# Altium integrated library Self made library.IntLib: 370 symbols (part 2 of 3) (continued)
## R0603_2.2K
designator R?  Résistance: 2.2 kOhms
Manufacturer 1: Vishay / Dale; Manufacturer Part Number 1: CRCW06032K20FKEB; Description 1: Résistances à couches épaisses - CMS 1/10watt 2.2Kohms 1%; Plage de températures de fonctionnement: - 55 C to + 155 C; Package/Boîte: 0603 (1608 metric); Conditionnement: Reel; Données de puissance: 100 mW; Produit: Thick Film Resistors SMD; Série: CRCW; Coefficient de température: 100 PPM / K; Tolérance: 1 %; Tension de voltage: 75 V; Code de caisse - po: 0603; Code de caisse - mm: 1608; Hauteur du boîtier: 0.45 mm; Longueur du boîtier: 1.55 mm; Largeur du boîtier: 0.85 mm; Fabricant: Vishay; Catégorie du produit: 0603 Thick Film Chip Resistors; Quantité standard du lot: 10000; Supplier 1: Mouser; Supplier Part Number 1: 71-CRCW06032K20FKEB; RoHS: RoHS Compliant By Exemption; Category: Résistances à couches épaisses - CMS; Stock 1: 28675; Pricing 1: 1=0.096, 10=0.013, 100=0.009, 1000=0.007, 10000=0.005, 30000=0.004, 50000=0.003 (CHF); Marque: Vishay / Dale; RoHS - Mouser: E; Minimum Order Quantity: 1; Reeling: True; ComponentLink1URL: http://www.mouser.com/ds/2/427/dcrcwe3-109170.pdf; ComponentLink1Description: http://www.mouser.com/ds/2/427/dcrcwe3-109170.pdf
footprint R0603
pins: 1, 2

## R0603_10K
designator ?R  Résistance: 10 kOhms
Manufacturer 1: Vishay / Dale; Manufacturer Part Number 1: CRCW060310K0FKEA; Description 1: Résistances à couches épaisses - CMS 1/10watt 10Kohms 1%; Plage de températures de fonctionnement: - 55 C to + 155 C; Package/Boîte: 0603 (1608 metric); Conditionnement: Reel; Données de puissance: 100 mW; Produit: Thick Film Resistors SMD; Série: CRCW; Coefficient de température: 100 PPM / K; Tolérance: 1 %; Tension de voltage: 75 V; Code de caisse - po: 0603; Code de caisse - mm: 1608; Hauteur du boîtier: 0.45 mm; Longueur du boîtier: 1.55 mm; Largeur du boîtier: 0.85 mm; Fabricant: Vishay; Catégorie du produit: 0603 Thick Film Chip Resistors; Quantité standard du lot: 5000; Supplier 1: Mouser; Supplier Part Number 1: 71-CRCW0603-10K-E3; RoHS: RoHS Compliant By Exemption; Category: Résistances à couches épaisses - CMS; Stock 1: 1170562; Pricing 1: 1=0.096, 10=0.042, 100=0.025, 500=0.020, 1000=0.017, 5000=0.005, 50000=0.004 (CHF); Marque: Vishay / Dale; RoHS - Mouser: E; Minimum Order Quantity: 1; Reeling: True; ComponentLink1URL: http://www.mouser.com/ds/2/427/dcrcwe3-109170.pdf; ComponentLink1Description: http://www.mouser.com/ds/2/427/dcrcwe3-109170.pdf
footprint R0603
pins: 1, 2

## R0603_45.3K
designator R?  Résistance: 45.3 kOhms
Manufacturer 1: Vishay / Dale; Manufacturer Part Number 1: CRCW060345K3FKEA; Description 1: Résistances à couches épaisses - CMS 1/10watt 45.3Kohms 1%; Plage de températures de fonctionnement: - 55 C to + 155 C; Package/Boîte: 0603 (1608 metric); Conditionnement: Reel; Données de puissance: 100 mW; Produit: Thick Film Resistors SMD; Série: CRCW; Coefficient de température: 100 PPM / K; Tolérance: 1 %; Tension de voltage: 75 V; Code de caisse - po: 0603; Code de caisse - mm: 1608; Hauteur du boîtier: 0.45 mm; Longueur du boîtier: 1.55 mm; Largeur du boîtier: 0.85 mm; Fabricant: Vishay; Catégorie du produit: 0603 Thick Film Chip Resistors; Quantité standard du lot: 5000; Supplier 1: Mouser; Supplier Part Number 1: 71-CRCW0603-45.3K-E3; RoHS: RoHS Compliant By Exemption; Category: Résistances à couches épaisses - CMS; Stock 1: 29593; Pricing 1: 1=0.096, 10=0.042, 100=0.025, 500=0.020, 1000=0.017, 5000=0.005, 50000=0.004 (CHF); Marque: Vishay / Dale; RoHS - Mouser: E; Minimum Order Quantity: 1; Reeling: True; ComponentLink1URL: http://www.mouser.com/ds/2/427/dcrcwe3-109170.pdf; ComponentLink1Description: http://www.mouser.com/ds/2/427/dcrcwe3-109170.pdf
footprint R0603
pins: 1, 2

## R0603_69.8K
designator R?  Résistance: 69.8 kOhms
Manufacturer 1: Vishay / Dale; Manufacturer Part Number 1: CRCW060369K8FKEA; Description 1: Résistances à couches épaisses - CMS 1/10watt 69.8Kohms 1%; Plage de températures de fonctionnement: - 55 C to + 155 C; Package/Boîte: 0603 (1608 metric); Conditionnement: Reel; Données de puissance: 100 mW; Produit: Thick Film Resistors SMD; Série: CRCW; Coefficient de température: 100 PPM / K; Tolérance: 1 %; Tension de voltage: 75 V; Code de caisse - po: 0603; Code de caisse - mm: 1608; Hauteur du boîtier: 0.45 mm; Longueur du boîtier: 1.55 mm; Largeur du boîtier: 0.85 mm; Fabricant: Vishay; Catégorie du produit: 0603 Thick Film Chip Resistors; Quantité standard du lot: 5000; Supplier 1: Mouser; Supplier Part Number 1: 71-CRCW0603-69.8K-E3; RoHS: RoHS Compliant By Exemption; Category: Résistances à couches épaisses - CMS; Stock 1: 48984; Pricing 1: 1=0.096, 10=0.042, 100=0.025, 500=0.020, 1000=0.017, 5000=0.005, 50000=0.004 (CHF); Marque: Vishay / Dale; RoHS - Mouser: E; Minimum Order Quantity: 1; Reeling: True; ComponentLink1URL: http://www.mouser.com/ds/2/427/dcrcwe3-109170.pdf; ComponentLink1Description: http://www.mouser.com/ds/2/427/dcrcwe3-109170.pdf
footprint R0603
pins: 1, 2

## R0603_100K
designator R?  Résistance: 100 kOhms
Manufacturer 1: Vishay / Dale; Manufacturer Part Number 1: CRCW0603100KFKEA; Description 1: Résistances à couches épaisses - CMS 1/10watt 100Kohms 1%; Plage de températures de fonctionnement: - 55 C to + 155 C; Package/Boîte: 0603 (1608 metric); Conditionnement: Reel; Données de puissance: 100 mW; Produit: Thick Film Resistors SMD; Série: CRCW; Coefficient de température: 100 PPM / K; Tolérance: 1 %; Tension de voltage: 75 V; Code de caisse - po: 0603; Code de caisse - mm: 1608; Hauteur du boîtier: 0.45 mm; Longueur du boîtier: 1.55 mm; Largeur du boîtier: 0.85 mm; Fabricant: Vishay; Catégorie du produit: 0603 Thick Film Chip Resistors; Quantité standard du lot: 5000; Supplier 1: Mouser; Supplier Part Number 1: 71-CRCW0603-100K-E3; RoHS: RoHS Compliant By Exemption; Category: Résistances à couches épaisses - CMS; Stock 1: 529180; Pricing 1: 1=0.096, 10=0.042, 100=0.025, 500=0.020, 1000=0.017, 5000=0.005, 50000=0.004 (CHF); Marque: Vishay / Dale; RoHS - Mouser: E; Minimum Order Quantity: 1; Reeling: True; ComponentLink1URL: http://www.mouser.com/ds/2/427/dcrcwe3-109170.pdf; ComponentLink1Description: http://www.mouser.com/ds/2/427/dcrcwe3-109170.pdf
footprint R0603
pins: 1, 2

## R0603_182K
designator R?  Résistance: 182 kOhms
Manufacturer 1: Vishay / Dale; Manufacturer Part Number 1: CRCW0603182KFKEA; Description 1: Résistances à couches épaisses - CMS 1/10watt 182Kohms 1%; Plage de températures de fonctionnement: - 55 C to + 155 C; Package/Boîte: 0603 (1608 metric); Conditionnement: Reel; Données de puissance: 100 mW; Produit: Thick Film Resistors SMD; Série: CRCW; Coefficient de température: 100 PPM / K; Tolérance: 1 %; Tension de voltage: 75 V; Code de caisse - po: 0603; Code de caisse - mm: 1608; Hauteur du boîtier: 0.45 mm; Longueur du boîtier: 1.55 mm; Largeur du boîtier: 0.85 mm; Fabricant: Vishay; Catégorie du produit: 0603 Thick Film Chip Resistors; Quantité standard du lot: 5000; Supplier 1: Mouser; Supplier Part Number 1: 71-CRCW0603-182K-E3; RoHS: RoHS Compliant By Exemption; Category: Résistances à couches épaisses - CMS; Stock 1: 40824; Pricing 1: 1=0.096, 10=0.042, 100=0.025, 500=0.020, 1000=0.017, 5000=0.005, 50000=0.004 (CHF); Marque: Vishay / Dale; RoHS - Mouser: E; Minimum Order Quantity: 1; Reeling: True; ComponentLink1URL: http://www.mouser.com/ds/2/427/dcrcwe3-109170.pdf; ComponentLink1Description: http://www.mouser.com/ds/2/427/dcrcwe3-109170.pdf
footprint R0603
pins: 1, 2

## R0603_220K
designator R?  Résistance: 220 kOhms  (hidden comment: R0603_220K)
MANUFACTURER: Vishay; MANUFACTURER_PART_NUMBER: CRCW0603220RFKEA; Manufacturer 1: Vishay / Dale; Manufacturer Part Number 1: CRCW0603220KJNEB; UNIT_PRICE: 0.076; Description 1: Résistances à couches épaisses - CMS 1/10watt 220Kohms 5%; Plage de températures de fonctionnement: - 55 C to + 155 C; Package/Boîte: 0603 (1608 metric); Conditionnement: Reel; Données de puissance: 100 mW; Produit: Thick Film Resistors SMD; Série: CRCW; Coefficient de température: 200 PPM / K; Tolérance: 5 %; Tension de voltage: 75 V; Code de caisse - po: 0603; Code de caisse - mm: 1608; Hauteur du boîtier: 0.45 mm; Longueur du boîtier: 1.55 mm; Largeur du boîtier: 0.85 mm; Catégorie du produit: 0603 Thick Film Chip Resistors; Quantité standard du lot: 10000; SUPPLIER: Mouser; SUPPLIER_PART_NUMBER: 71-CRCW0603-220-E3; Supplier 1: Mouser; Supplier Part Number 1: 71-CRCW0603220KJNEB; RoHS: RoHS Compliant By Exemption; Category: Résistances à couches épaisses - CMS; Stock 1: 39750; Pricing 1: 1=0.096, 10=0.012, 100=0.008, 10000=0.004, 30000=0.002 (CHF); Marque: Vishay / Dale; Fabricant: Vishay; RoHS - Mouser: E; Minimum Order Quantity: 1; Reeling: True; ComponentLink1URL: http://www.mouser.com/ds/2/427/dcrcwe3-109170.pdf; ComponentLink1Description: http://www.mouser.com/ds/2/427/dcrcwe3-109170.pdf
footprint R0603
pins: 1, 2

## R0603_220R
designator R?  Résistance: 220 Ohms  (hidden comment: R0603_220R)
Manufacturer 1: Vishay / Dale; Manufacturer Part Number 1: CRCW0603220RFKEA; Description 1: Résistances à couches épaisses - CMS 1/10watt 220ohms 1%; Plage de températures de fonctionnement: - 55 C to + 155 C; Package/Boîte: 0603 (1608 metric); Conditionnement: Reel; Données de puissance: 100 mW; Produit: Thick Film Resistors SMD; Série: CRCW; Coefficient de température: 100 PPM / K; Tolérance: 1 %; Tension de voltage: 75 V; Code de caisse - po: 0603; Code de caisse - mm: 1608; Hauteur du boîtier: 0.45 mm; Longueur du boîtier: 1.55 mm; Largeur du boîtier: 0.85 mm; Fabricant: Vishay; Catégorie du produit: 0603 Thick Film Chip Resistors; Quantité standard du lot: 5000; Supplier 1: Mouser; Supplier Part Number 1: 71-CRCW0603-220-E3; RoHS: RoHS Compliant By Exemption; Category: Résistances à couches épaisses - CMS; Stock 1: 64079; Pricing 1: 1=0.096, 10=0.042, 100=0.025, 500=0.020, 1000=0.017, 5000=0.005, 50000=0.004 (CHF); Marque: Vishay / Dale; RoHS - Mouser: E; Minimum Order Quantity: 1; Reeling: True; ComponentLink1URL: http://www.mouser.com/ds/2/427/dcrcwe3-109170.pdf; ComponentLink1Description: http://www.mouser.com/ds/2/427/dcrcwe3-109170.pdf
footprint R0603
pins: 1, 2

## R2010_0.01R
designator R?  Resistance: 0.01 Ohms
Manufacturer: Vishay / Dale; Manufacturer Part Number: WSL2010R0100FEA18; Power Rating: 1 W; Temperature Coefficient: 75 PPM / C; Tolerance: 1 %; Case Height: 0.635 mm; Case Length: 5 mm; Case Width: 2.5 mm; Supplier 1: Mouser; RoHS: RoHS Compliant; Category: Current Sense Resistors - SMD; Stock 1: 15681; Pricing 1: 1=1.05, 25=0.884, 100=0.765, 250=0.646, 500=0.544, 1000=0.453, 4000=0.404 (CHF); Operating Temperature Range: - 65 C to + 170 C; Package/Case: 2010 (5025 metric); Packaging: Reel; Product: Metal Element Current Sensing Resistors; Series: WSL..18; Termination Style: SMD/SMT; Type: Power Metal Strip Resistor; Brand: Vishay / Dale; Case Code - in: 2010; Case Code - mm: 5025; Product Category: SMD Power Metal Strip/Current Sensing Resistors; Standard Pack Qty: 4000; Tradename: Power Metal Strip; RoHS - Mouser: Y; Minimum Order Quantity: 1; Reeling: True; ComponentLink1URL: http://www.mouser.com/ds/2/427/wslhigh-101698.pdf; ComponentLink1Description: http://www.mouser.com/ds/2/427/wslhigh-101698.pdf; Supplier Part Number 1: 71-WSL2010R0100FEA18
footprint 2010_2
pins: 1, 2

## R_0402
designator ?, comment Résistance avec différents footprints
footprint R0402
pins: 1, 2

## R_603
designator ?, comment Résistance avec différents footprints
footprint R0603
pins: 1, 2

## R_805
designator ?, comment Résistance avec différents footprints
footprint 0805
pins: 1, 2

## R_1206
designator ?, comment Résistance avec différents footprints
footprint 1206
pins: 1, 2

## R_1210
designator ?, comment Résistance avec différents footprints
footprint 1210
pins: P$1 1, P$2 2

## REFROIDISSEUR
designator ?
footprint FK245MI247V
pins: P$1, P$2

## REGUL_3.3V_TSR_1_2433
designator IC?, comment VOLTAGE REGULATOR
footprint DC-DC_TSR-1
pins: 1 IN, 2 REG, 3 OUT

## REGUL_5V_TSR_1_2450
designator IC?, comment VOLTAGE REGULATOR
footprint DC-DC_TSR-1
pins: 1 IN, 2 REG, 3 OUT

## REPETEUR_COUVERCLE
designator ?
footprint 0603

## RES_805
designator ?
footprint 0805
pins: 1, 2

## RES_1206_0R
designator R?  Resistance: 0 Ohms  (hidden comment: RES_1206_0R)
Manufacturer: Vishay / Dale; Manufacturer Part Number: CRCW12060000Z0EA; Case Height: 0.55 mm; Case Length: 3.2 mm; Case Width: 1.6 mm; Digger CMP: CMP3842; Supplier 1: Mouser; RoHS: RoHS Compliant By Exemption; Category: Thick Film Resistors - SMD; Stock 1: 565688; Pricing 1: 1=0.096, 10=0.021, 100=0.013, 500=0.011, 1000=0.008, 5000=0.008, 10000=0.007, 25000=0.006, 50000=0.005 (CHF); Operating Temperature Range: - 55 C to + 155 C; Package/Case: 1206 (3216 metric); Packaging: Reel; Power Rating: -; Product: Thick Film Resistors Zero-Ohm; Series: CRCW; Temperature Coefficient: -; Tolerance: -; Voltage Rating: -; Brand: Vishay / Dale; Case Code - in: 1206; Case Code - mm: 3216; Product Category: 1206 Thick Film Chip Resistors; Standard Pack Qty: 5000; RoHS - Mouser: E; Minimum Order Quantity: 1; Reeling: True; ComponentLink1URL: http://www.mouser.com/ds/2/427/dcrcwe3-109170.pdf; ComponentLink1Description: http://www.mouser.com/ds/2/427/dcrcwe3-109170.pdf; Supplier Part Number 1: 71-CRCW1206-0-E3
footprint 1206
pins: 1, 2

## RES_1206_1K
designator R?  Resistance: 1 kOhms  (hidden comment: RES_1206_1K)
Manufacturer: Vishay / Dale; Manufacturer Part Number: CRCW12061K00FKEAHP; Power Rating: 500 mW (1/2 W); Temperature Coefficient: 100 PPM / C; Tolerance: 1 %; Voltage Rating: 200 V; Case Height: 0.5 mm; Case Length: 3.2 mm; Case Width: 1.6 mm; Digger CMP: CMP3565; Supplier 1: Mouser; RoHS: RoHS Compliant By Exemption; Category: Thick Film Resistors - SMD; Stock 1: 22378; Pricing 1: 1=0.427, 10=0.263, 100=0.151, 1000=0.103, 5000=0.096, 10000=0.085, 25000=0.076, 50000=0.064, 100000=0.054 (CHF); Operating Temperature Range: - 55 C to + 155 C; Package/Case: 1206 (3216 metric); Packaging: Reel; Product: Thick Film Resistors SMD; Series: CRCW-HP e3; Type: Pulse Proof, High Power Thick Film Chip Resistors; Brand: Vishay / Dale; Case Code - in: 1206; Case Code - mm: 3216; Case Diameter: -; Product Category: 1206 Thick Film Chip Resistors; Standard Pack Qty: 5000; RoHS - Mouser: E; Minimum Order Quantity: 1; Reeling: True; ComponentLink1URL: http://www.mouser.com/ds/2/427/crcwhpe3-46056.pdf; ComponentLink1Description: http://www.mouser.com/ds/2/427/crcwhpe3-46056.pdf; Supplier Part Number 1: 71-CRCW12061K00FKEAH
footprint 1206
pins: 1, 2

## RES_1206_2K2
designator R?  Resistance: 2.2 kOhms  (hidden comment: RES_1206_2K2)
Manufacturer: Vishay / Dale; Manufacturer Part Number: CRCW12062K20FKEAHP; Power Rating: 500 mW (1/2 W); Temperature Coefficient: 100 PPM / C; Tolerance: 1 %; Voltage Rating: 200 V; Case Height: 0.5 mm; Case Length: 3.2 mm; Case Width: 1.6 mm; Product Status: New at Mouser; Digger CMP: CMP4435; Supplier 1: Mouser; RoHS: RoHS Compliant By Exemption; Category: Thick Film Resistors - SMD; Stock 1: 908; Pricing 1: 1=0.446, 10=0.245, 100=0.141, 1000=0.096, 5000=0.087, 10000=0.085, 25000=0.075, 50000=0.063, 100000=0.053 (CHF); Operating Temperature Range: - 55 C to + 155 C; Package/Case: 1206 (3216 metric); Packaging: Reel; Product: Thick Film Resistors SMD; Series: CRCW-HP e3; Type: Pulse Proof, High Power Thick Film Chip Resistors; Brand: Vishay / Dale; Case Code - in: 1206; Case Code - mm: 3216; Case Diameter: -; Product Category: 1206 Thick Film Chip Resistors; Standard Pack Qty: 5000; RoHS - Mouser: E; Minimum Order Quantity: 1; Reeling: True; ComponentLink1URL: http://www.mouser.com/ds/2/427/crcwhpe3-46056.pdf; ComponentLink1Description: http://www.mouser.com/ds/2/427/crcwhpe3-46056.pdf; Supplier Part Number 1: 71-CRCW12062K20FKEAH
footprint 1206
pins: 1, 2

## RES_1206_4K7
designator R?  Resistance: 4.7 kOhms  (hidden comment: RES_1206_4K7)
Manufacturer: Vishay / Dale; Manufacturer Part Number: CRCW12064K70FKEAHP; Power Rating: 500 mW (1/2 W); Temperature Coefficient: 100 PPM / C; Tolerance: 1 %; Voltage Rating: 200 V; Case Height: 0.5 mm; Case Length: 3.2 mm; Case Width: 1.6 mm; Digger CMP: CMP2487; Supplier 1: Mouser; RoHS: RoHS Compliant By Exemption; Category: Thick Film Resistors - SMD; Stock 1: 21999; Pricing 1: 1=0.427, 10=0.263, 100=0.151, 1000=0.103, 5000=0.096, 10000=0.085, 25000=0.076, 50000=0.064, 100000=0.054 (CHF); Operating Temperature Range: - 55 C to + 155 C; Package/Case: 1206 (3216 metric); Packaging: Reel; Product: Thick Film Resistors SMD; Series: CRCW-HP e3; Type: Pulse Proof, High Power Thick Film Chip Resistors; Brand: Vishay / Dale; Case Code - in: 1206; Case Code - mm: 3216; Case Diameter: -; Product Category: 1206 Thick Film Chip Resistors; Standard Pack Qty: 5000; RoHS - Mouser: E; Minimum Order Quantity: 1; Reeling: True; ComponentLink1URL: http://www.mouser.com/ds/2/427/crcwhpe3-46056.pdf; ComponentLink1Description: http://www.mouser.com/ds/2/427/crcwhpe3-46056.pdf; Supplier Part Number 1: 71-CRCW12064K70FKEAH
footprint 1206
pins: 1, 2

## RES_1206_8K2
designator R?  Resistance: 8.2 kOhms  (hidden comment: RES_1206_8K2)
Manufacturer: Vishay / Dale; Manufacturer Part Number: CRCW12068K20FKEA; Power Rating: 250 mW (1/4 W); Temperature Coefficient: 100 PPM / K; Tolerance: 1 %; Voltage Rating: 200 V; Case Height: 0.55 mm; Case Length: 3.2 mm; Case Width: 1.6 mm; Digger CMP: CMP4436; Supplier 1: Mouser; RoHS: RoHS Compliant By Exemption; Category: Thick Film Resistors - SMD; Stock 1: 18649; Pricing 1: 1=0.096, 10=0.053, 100=0.030, 1000=0.021, 5000=0.011, 10000=0.009, 25000=0.008, 50000=0.006, 100000=0.005 (CHF); Operating Temperature Range: - 55 C to + 155 C; Package/Case: 1206 (3216 metric); Packaging: Reel; Product: Thick Film Resistors SMD; Series: CRCW; Brand: Vishay / Dale; Case Code - in: 1206; Case Code - mm: 3216; Product Category: 1206 Thick Film Chip Resistors; Standard Pack Qty: 5000; RoHS - Mouser: E; Minimum Order Quantity: 1; Reeling: True; ComponentLink1URL: http://www.mouser.com/ds/2/427/dcrcwe3-109170.pdf; ComponentLink1Description: http://www.mouser.com/ds/2/427/dcrcwe3-109170.pdf; Supplier Part Number 1: 71-CRCW1206-8.2K-E3
footprint 1206
pins: 1, 2

## RES_1206_10K
designator R?  Resistance: 10 kOhms  (hidden comment: RES_1206_10K)
Manufacturer: Vishay / Dale; Manufacturer Part Number: CRCW120610K0FKEB; Power Rating: 250 mW (1/4 W); Temperature Coefficient: 100 PPM / K; Tolerance: 1 %; Voltage Rating: 200 V; Case Height: 0.55 mm; Case Length: 3.2 mm; Case Width: 1.6 mm; Digger DTR: CMP3567; Supplier 1: Mouser; RoHS: RoHS Compliant By Exemption; Category: Thick Film Resistors - SMD; Stock 1: 36112; Pricing 1: 1=0.096, 10=0.035, 100=0.026, 1000=0.009, 10000=0.006, 50000=0.005 (CHF); Operating Temperature Range: - 55 C to + 155 C; Package/Case: 1206 (3216 metric); Packaging: Reel; Product: Thick Film Resistors SMD; Series: CRCW; Brand: Vishay / Dale; Case Code - in: 1206; Case Code - mm: 3216; Product Category: 1206 Thick Film Chip Resistors; Standard Pack Qty: 10000; RoHS - Mouser: E; Minimum Order Quantity: 1; Reeling: True; ComponentLink1URL: http://www.mouser.com/ds/2/427/dcrcwe3-109170.pdf; ComponentLink1Description: http://www.mouser.com/ds/2/427/dcrcwe3-109170.pdf; Supplier Part Number 1: 71-CRCW120610K0FKEB
footprint 1206
pins: 1, 2

## RES_1206_10R
designator R?  Resistance: 10 Ohms  (hidden comment: RES_1206_10R)
Manufacturer: Vishay / Dale; Manufacturer Part Number: CRCW120610R0FKEAHP; Power Rating: 500 mW (1/2 W); Temperature Coefficient: 100 PPM / C; Tolerance: 1 %; Voltage Rating: 200 V; Case Height: 0.5 mm; Case Length: 3.2 mm; Case Width: 1.6 mm; Digger CMP: CMP3843; Supplier 1: Mouser; RoHS: RoHS Compliant By Exemption; Category: Thick Film Resistors - SMD; Stock 1: 17364; Pricing 1: 1=0.427, 10=0.263, 100=0.151, 1000=0.103, 5000=0.096, 10000=0.085, 25000=0.076, 50000=0.064, 100000=0.054 (CHF); Operating Temperature Range: - 55 C to + 155 C; Package/Case: 1206 (3216 metric); Packaging: Reel; Product: Thick Film Resistors SMD; Series: CRCW-HP e3; Type: Pulse Proof, High Power Thick Film Chip Resistors; Brand: Vishay / Dale; Case Code - in: 1206; Case Code - mm: 3216; Case Diameter: -; Product Category: 1206 Thick Film Chip Resistors; Standard Pack Qty: 5000; RoHS - Mouser: E; Minimum Order Quantity: 1; Reeling: True; ComponentLink1URL: http://www.mouser.com/ds/2/427/crcwhpe3-46056.pdf; ComponentLink1Description: http://www.mouser.com/ds/2/427/crcwhpe3-46056.pdf; Supplier Part Number 1: 71-CRCW120610R0FKEAH
footprint 1206
pins: 1, 2

## RES_1206_11K
designator R?  Resistance: 11 kOhms  (hidden comment: RES_1206_11K)
Manufacturer: Vishay / Dale; Manufacturer Part Number: CRCW120611K0FKEA; Power Rating: 250 mW (1/4 W); Temperature Coefficient: 100 PPM / K; Tolerance: 1 %; Voltage Rating: 200 V; Case Height: 0.55 mm; Case Length: 3.2 mm; Case Width: 1.6 mm; Digger DTR: CMP4437; Supplier 1: Mouser; RoHS: RoHS Compliant By Exemption; Category: Thick Film Resistors - SMD; Stock 1: 12152; Pricing 1: 1=0.096, 10=0.053, 100=0.030, 1000=0.021, 5000=0.011, 10000=0.009, 25000=0.008, 50000=0.006, 100000=0.005 (CHF); Operating Temperature Range: - 55 C to + 155 C; Package/Case: 1206 (3216 metric); Packaging: Reel; Product: Thick Film Resistors SMD; Series: CRCW; Brand: Vishay / Dale; Case Code - in: 1206; Case Code - mm: 3216; Product Category: 1206 Thick Film Chip Resistors; Standard Pack Qty: 5000; RoHS - Mouser: E; Minimum Order Quantity: 1; Reeling: True; ComponentLink1URL: http://www.mouser.com/ds/2/427/dcrcwe3-109170.pdf; ComponentLink1Description: http://www.mouser.com/ds/2/427/dcrcwe3-109170.pdf; Supplier Part Number 1: 71-CRCW1206-11K-E3
footprint 1206
pins: 1, 2

## RES_1206_51R
designator R?
footprint 1206
pins: 1, 2

## RES_1206_56R
designator R?
footprint 1206
pins: 1, 2

## RES_1206_68K
designator R?
footprint 1206
pins: 1, 2

## RES_1206_100K
designator R?  Resistance: 100 kOhms  (hidden comment: RES_1206_100K)
Manufacturer: Vishay / Dale; Manufacturer Part Number: CRCW1206100KFKEB; Power Rating: 250 mW (1/4 W); Temperature Coefficient: 100 PPM / K; Tolerance: 1 %; Voltage Rating: 200 V; Case Height: 0.55 mm; Case Length: 3.2 mm; Case Width: 1.6 mm; Digger CMP: CMP3844; Supplier 1: Mouser; RoHS: RoHS Compliant By Exemption; Category: Thick Film Resistors - SMD; Stock 1: 26788; Pricing 1: 1=0.096, 10=0.035, 100=0.026, 1000=0.009, 10000=0.006, 50000=0.005 (CHF); Operating Temperature Range: - 55 C to + 155 C; Package/Case: 1206 (3216 metric); Packaging: Reel; Product: Thick Film Resistors SMD; Series: CRCW; Brand: Vishay / Dale; Case Code - in: 1206; Case Code - mm: 3216; Product Category: 1206 Thick Film Chip Resistors; Standard Pack Qty: 10000; RoHS - Mouser: E; Minimum Order Quantity: 1; Reeling: True; ComponentLink1URL: http://www.mouser.com/ds/2/427/dcrcwe3-109170.pdf; ComponentLink1Description: http://www.mouser.com/ds/2/427/dcrcwe3-109170.pdf; Supplier Part Number 1: 71-CRCW1206100KFKEB
footprint 1206
pins: 1, 2

## RES_1206_100R
designator R?
footprint 1206
pins: 1, 2

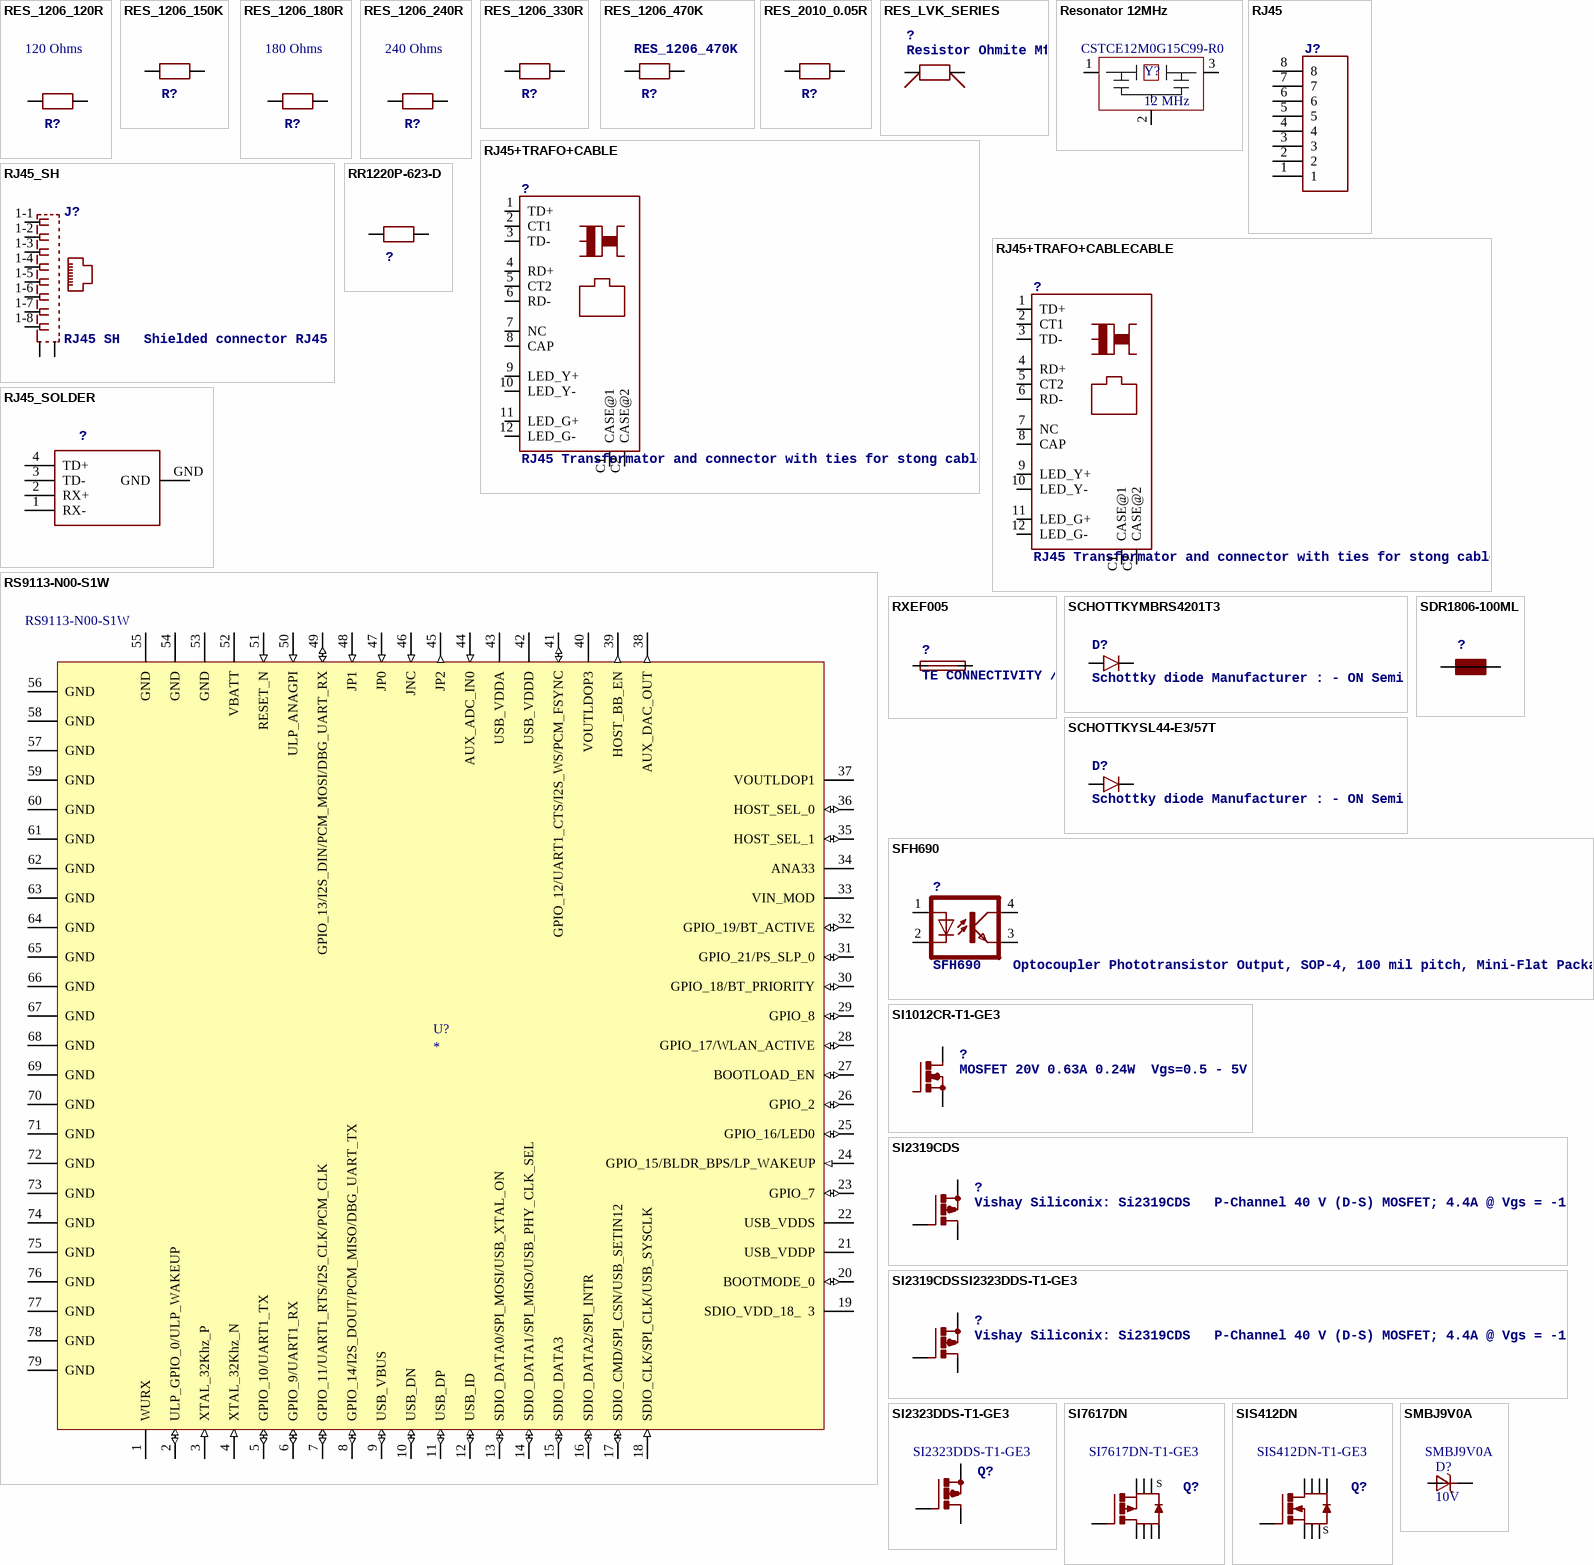
[diagram p16: symbols RES_1206_120R to SMBJ9V0A]

## RES_1206_120R
designator R?  Resistance: 120 Ohms  (hidden comment: RES_1206_120R)
Manufacturer: Vishay / Dale; Manufacturer Part Number: CRCW1206120RFKEAHP; Power Rating: 500 mW (1/2 W); Temperature Coefficient: 100 PPM / C; Tolerance: 1 %; Voltage Rating: 200 V; Case Height: 0.5 mm; Case Length: 3.2 mm; Case Width: 1.6 mm; Digger DTR: CMP3566; Supplier 1: Mouser; RoHS: RoHS Compliant By Exemption; Category: Thick Film Resistors - SMD; Stock 1: 10225; Pricing 1: 1=0.427, 10=0.233, 100=0.134, 1000=0.124, 5000=0.114, 10000=0.085, 25000=0.075, 50000=0.063, 100000=0.053 (CHF); Operating Temperature Range: - 55 C to + 155 C; Package/Case: 1206 (3216 metric); Packaging: Reel; Product: Thick Film Resistors SMD; Series: CRCW-HP e3; Type: Pulse Proof, High Power Thick Film Chip Resistors; Brand: Vishay / Dale; Case Code - in: 1206; Case Code - mm: 3216; Case Diameter: -; Product Category: 1206 Thick Film Chip Resistors; Standard Pack Qty: 5000; RoHS - Mouser: E; Minimum Order Quantity: 1; Reeling: True; ComponentLink1URL: http://www.mouser.com/ds/2/427/crcwhpe3-46056.pdf; ComponentLink1Description: http://www.mouser.com/ds/2/427/crcwhpe3-46056.pdf; Supplier Part Number 1: 71-CRCW1206120RFKEAH
footprint 1206
pins: 1, 2

## RES_1206_150K
designator R?
footprint 1206
pins: 1, 2

## RES_1206_180R
designator R?  Resistance: 180 Ohms  (hidden comment: RES_1206_180R)
Manufacturer: Vishay / Dale; Manufacturer Part Number: CRCW1206180RFKEAHP; Power Rating: 500 mW (1/2 W); Temperature Coefficient: 100 PPM / C; Tolerance: 1 %; Voltage Rating: 200 V; Case Height: 0.5 mm; Case Length: 3.2 mm; Case Width: 1.6 mm; Product Status: New at Mouser; Digger CMP: CMP4438; Supplier 1: Mouser; RoHS: RoHS Compliant; Category: Thick Film Resistors - SMD; Stock 1: 0; Pricing 1: 1=0.446, 10=0.245, 100=0.141, 1000=0.096, 5000=0.087, 10000=0.085, 25000=0.075, 50000=0.063, 100000=0.053 (CHF); Operating Temperature Range: - 55 C to + 155 C; Package/Case: 1206 (3216 metric); Packaging: Reel; Product: Thick Film Resistors SMD; Series: CRCW-HP e3; Type: Pulse Proof, High Power Thick Film Chip Resistors; Brand: Vishay / Dale; Case Code - in: 1206; Case Code - mm: 3216; Case Diameter: -; Product Category: 1206 Thick Film Chip Resistors; RoHS - Mouser: E; Minimum Order Quantity: 1; Reeling: True; ComponentLink1URL: http://www.mouser.com/ds/2/427/crcwhpe3-46056.pdf; ComponentLink1Description: http://www.mouser.com/ds/2/427/crcwhpe3-46056.pdf; Supplier Part Number 1: 71-CRCW1206180RFKEAH
footprint 1206
pins: 1, 2

## RES_1206_240R
designator R?  Resistance: 240 Ohms  (hidden comment: RES_1206_240R)
Manufacturer: Vishay / Dale; Manufacturer Part Number: CRCW1206240RJNEAHP; Power Rating: 500 mW (1/2 W); Temperature Coefficient: 200 PPM / C; Tolerance: 5 %; Voltage Rating: 200 V; Case Height: 0.5 mm; Case Length: 3.2 mm; Case Width: 1.6 mm; Digger CMP: CMP4223; Supplier 1: Mouser; RoHS: RoHS Compliant By Exemption; Category: Thick Film Resistors - SMD; Stock 1: 5000; Pricing 1: 1=0.446, 10=0.233, 100=0.134, 1000=0.091, 5000=0.083, 10000=0.075, 25000=0.066, 50000=0.055, 100000=0.046 (CHF); Operating Temperature Range: - 55 C to + 155 C; Package/Case: 1206 (3216 metric); Packaging: Reel; Product: Thick Film Resistors SMD; Series: CRCW-HP e3; Type: Pulse Proof, High Power Thick Film Chip Resistors; Brand: Vishay / Dale; Case Code - in: 1206; Case Code - mm: 3216; Case Diameter: -; Product Category: 1206 Thick Film Chip Resistors; Standard Pack Qty: 5000; RoHS - Mouser: E; Minimum Order Quantity: 1; Reeling: True; ComponentLink1URL: http://www.mouser.com/ds/2/427/crcwhpe3-46056.pdf; ComponentLink1Description: http://www.mouser.com/ds/2/427/crcwhpe3-46056.pdf; Supplier Part Number 1: 71-CRCW1206240RJNEAH
footprint 1206
pins: 1, 2

## RES_1206_330R
designator R?
footprint 1206
pins: 1, 2

## RES_1206_470K
designator R?
footprint 1206
pins: 1, 2

## RES_2010_0.05R
designator R?
footprint 2010
pins: P$1 1, P$2 2

## RES_LVK_SERIES
designator ?, comment Resistor Ohmite Mfg.Co. LVK Series   Four Terminal High Precision Current Sense
footprint 2010_SENS
pins: I1, I2, V1, V2